# Altium footprint library SparkFun.PCBLIB: 674 footprints (part 23 of 44)
Each footprint in its own frame and in the unit in brackets; x right, y up, seen from the top. Pads: shape width x height; smd on the part's side, far side on the other; paste and mask are expansions set on the pad; w line width, h text height; cw(c..) or ccw(c..) is an arc to the next point about the centre after c.
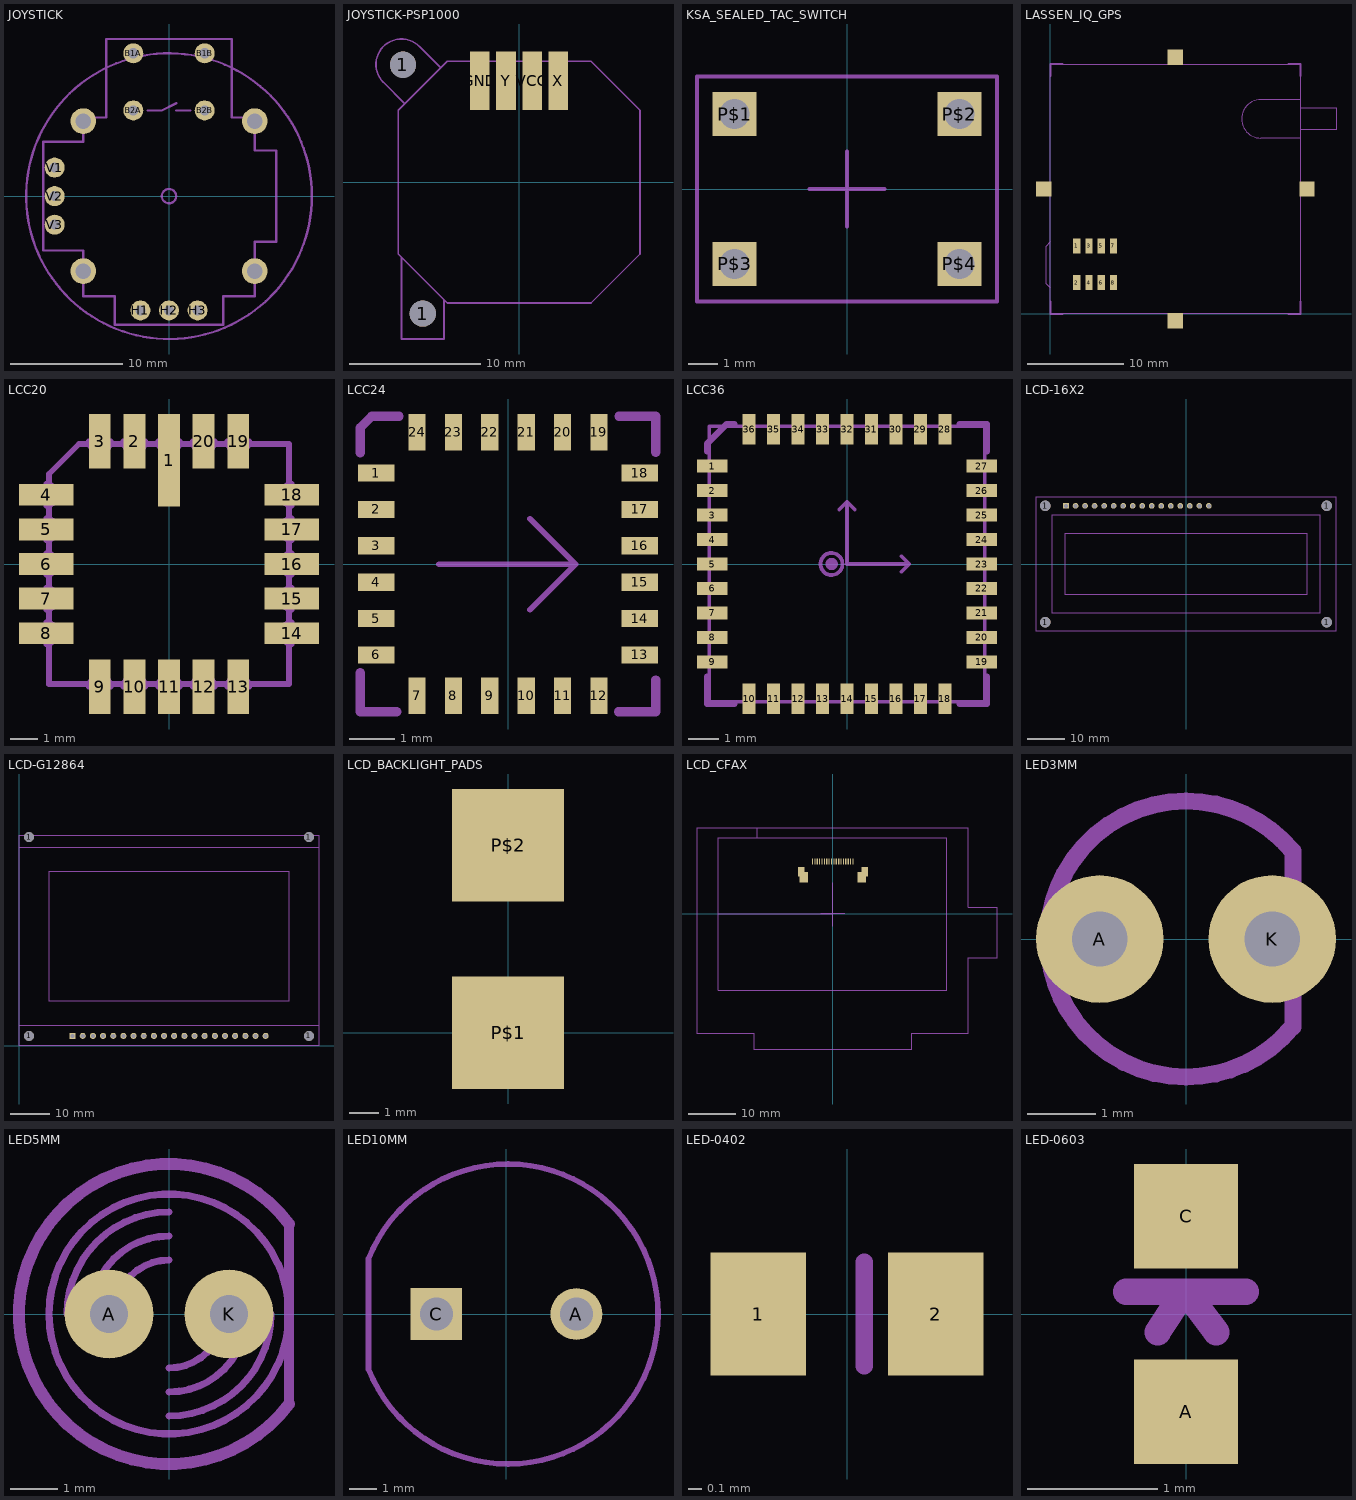
[diagram p22: the footprints below, top view; thin cyan lines are the x and y axes]

## JOYSTICK [mil]
pads (14):
  round 70 hole 35.43: B1A(-125,500) B1B(125,500) B2A(-125,300) B2B(125,300)
  round 70 hole 35: H1(-100,-400) H2(0,-400) H3(100,-400) V1(-400,100) V2(-400,0) V3(-400,-100)
  round 90 hole 55: MOUNT1(-300,262.5) MOUNT2(-300,-262.5) MOUNT3(300,-262.5) MOUNT4(300,262.5)
Mechanical 2:
  circle w8: c0,0 r25
  lines w8: -440,-190 -300,-190 -300,-350 -190,-350 -190,-450 190,-450 190,-350 300,-350 300,-160 375,-160 375,160 300,160 300,275 220,275 220,550 -220,550 -220,275 -300,275 -300,190 -440,190 -440,-190
Mechanical 18:
  circle w8: c0,0 r500
  lines w8: -75,300 -25,300 25,325 ; 25,300 75,300

## JOYSTICK-PSP1000 [mm]
pads (6):
  round 2 hole 2: 1(-8.89,8.985) 1(-7.375,-10.06)
  rect 1.5x4.5 smd: GND(-3,7.75) VCC(1,7.75) X(3,7.75) Y(-1,7.75)
Mechanical 18:
  lines w0.127: -10.4,7.658 -8.75,6 ; -10.381,7.631 cw(c-9.006,9.006) -7.631,10.381 ; -7.65,10.408 -6,8.75 ; -9,-5.75 -9.25,-5.5 -9.25,5.5 -8.75,6 ; -9,-5.75 -5.75,-9 ; -9,-5.75 -9,-12 -5.75,-12 -5.75,-9 ; -8.75,6 -6,8.75 ; -6,8.75 -5.5,9.25 5.5,9.25 9.25,5.5 9.25,-5.5 5.5,-9.25 -5.5,-9.25 -5.75,-9

## KSA_SEALED_TAC_SWITCH [mm]
pads (4):
  rect 1.5x1.5 hole 1: P$1(-3.81,2.54) P$2(3.81,2.54) P$3(-3.81,-2.54) P$4(3.81,-2.54)
Mechanical 2:
  lines w0.127: -1.27,0 1.27,0 ; 0,-1.27 0,1.27 ; -5.08,-3.81 5.08,-3.81 5.08,3.81 -5.08,3.81 -5.08,-3.81

## LASSEN_IQ_GPS [mil]
pads (12):
  rect 30x60 smd: 1(108.35,278.58) 2(108.35,128.58) 3(158.35,278.58) 4(158.35,128.58) 5(208.35,278.58) 6(208.35,128.58) 7(258.35,278.58) 8(258.35,128.58)
  rect 62.99x62.99 smd paste-31.5: GND1(-27.56,511.81) GND2(511.81,1051.18) GND3(1051.18,511.81) GND4(511.81,-27.56)
Mechanical 2:
  lines w8: 0,50 0,0 50,0 ; 0,975 0,1025 50,1025 ; 975,0 1025,0 1025,50 ; 975,1025 1025,1025 1025,975
Mechanical 18:
  lines w5: 1023.62,720.47 862.2,720.47 cw(c862.2,799.21) 862.2,877.95 1023.62,877.95 ; 1025,755 1170,755 1170,845 1025,845 ; 0,106.3 0,0 1023.62,0 1023.62,1023.62 0,1023.62 0,295.28 ; 0,106.3 0,295.28 ; 0,106.3 -19.69,125.98 -19.69,275.59 0,295.28

## LCC20 [mil]
pads (20):
  rect 31.5x133.86 smd: 1(0,149.61)
  rect 31.5x78.74 smd: 2(-50,177.17) 3(-100,177.17) 9(-100,-177.17) 10(-50,-177.17) 11(0,-177.17) 12(50,-177.17) 13(100,-177.17) 19(100,177.17) 20(50,177.17)
  rect 78.74x31.5 smd: 4(-177.17,100) 5(-177.17,50) 6(-177.17,0) 7(-177.17,-50) 8(-177.17,-100) 14(177.17,-100) 15(177.17,-50) 16(177.17,0) 17(177.17,50) 18(177.17,100)
Mechanical 18:
  lines w8: -177.17,-115.75 ccw(c-177.17,-100) -177.17,-84.25 ; -177.17,-65.75 ccw(c-177.17,-50) -177.17,-34.25 ; -177.17,-15.75 ccw(c-177.17,0) -177.17,15.75 ; -177.17,34.25 ccw(c-177.17,50) -177.17,65.75 ; -177.17,84.25 ccw(c-177.17,100) -177.17,115.75 ; -173.23,-173.62 -173.23,-173.23 ; -173.23,-115.75 -173.23,-173.23 ; -173.23,-84.25 -173.23,-65.75 ; -173.23,-34.25 -173.23,-15.75 ; -173.23,15.75 -173.23,34.25 ; -173.23,65.75 -173.23,84.25 ; -173.23,115.75 -173.23,129.92 -129.92,173.23 -115.75,173.23 ; -115.75,-177.17 cw(c-100,-177.17) -84.25,-177.17 ; -115.75,-173.23 -173.23,-173.23 ; -115.75,177.17 ccw(c-100,177.17) -84.25,177.17 ; -84.25,-173.23 -65.75,-173.23 ; -84.25,173.23 -65.75,173.23 ; -65.75,-177.17 cw(c-50,-177.17) -34.25,-177.17 ; -65.75,177.17 ccw(c-50,177.17) -34.25,177.17 ; -34.25,-173.23 -15.75,-173.23 ; -34.25,173.23 -15.75,173.23 ; -15.75,-177.17 cw(c0,-177.17) 15.75,-177.17 ; -15.75,177.17 ccw(c0,177.17) 15.75,177.17 ; 15.75,-173.23 34.25,-173.23 ; 15.75,173.23 34.25,173.23 ; 34.25,-177.17 cw(c50,-177.17) 65.75,-177.17 ; 34.25,177.17 ccw(c50,177.17) 65.75,177.17 ; 65.75,-173.23 84.25,-173.23 ; 65.75,173.23 84.25,173.23 ; 84.25,-177.17 cw(c100,-177.17) 115.75,-177.17 ; 84.25,177.17 ccw(c100,177.17) 115.75,177.17 ; 115.75,-173.23 173.23,-173.23 173.23,-115.75 ; 115.75,173.23 173.23,173.23 173.23,115.75 ; 173.23,-84.25 173.23,-65.75 ; 173.23,-34.25 173.23,-15.75 ; 173.23,15.75 173.23,34.25 ; 173.23,65.75 173.23,84.25 ; 177.17,-115.75 cw(c177.17,-100) 177.17,-84.25 ; 177.17,-65.75 cw(c177.17,-50) 177.17,-34.25 ; 177.17,-15.75 cw(c177.17,0) 177.17,15.75 ; 177.17,34.25 cw(c177.17,50) 177.17,65.75 ; 177.17,84.25 cw(c177.17,100) 177.17,115.75

## LCC24 [mm]
pads (24):
  rect 0.8x0.38 smd: 1(-2.9,2.01) 2(-2.9,1.21) 3(-2.9,0.41) 4(-2.9,-0.39) 5(-2.9,-1.19) 6(-2.9,-1.99) 13(2.9,-1.99) 14(2.9,-1.19) 15(2.9,-0.39) 16(2.9,0.41) 17(2.9,1.21) 18(2.9,2.01)
  rect 0.38x0.8 smd: 7(-2,-2.89) 8(-1.2,-2.89) 9(-0.4,-2.89) 10(0.4,-2.89) 11(1.2,-2.89) 12(2,-2.89) 19(2,2.91) 20(1.2,2.91) 21(0.4,2.91) 22(-0.4,2.91) 23(-1.2,2.91) 24(-2,2.91)
Mechanical 2:
  lines w0.203: -3.25,-2.38 -3.25,-3.24 -2.45,-3.24 ; -3.25,2.46 -3.25,3.01 -3,3.26 -2.4,3.26 ; 2.43,-3.24 3.25,-3.24 3.25,-2.54 ; 2.44,3.26 3.25,3.26 3.25,2.47
Mechanical 18:
  lines w0.127: -1.515,0.005 1.485,0.005 ; 0.485,-0.995 1.485,0.005 ; 0.485,1.005 1.485,0.005

## LCC36 [mm]
pads (36):
  rect 1x0.42 smd: 1(-4.4,3.2) 2(-4.4,2.4) 3(-4.4,1.6) 4(-4.4,0.8) 5(-4.4,0) 6(-4.4,-0.8) 7(-4.4,-1.6) 8(-4.4,-2.4) 9(-4.4,-3.2) 19(4.4,-3.2) 20(4.4,-2.4) 21(4.4,-1.6) 22(4.4,-0.8) 23(4.4,0) 24(4.4,0.8) 25(4.4,1.6) 26(4.4,2.4) 27(4.4,3.2)
  rect 0.42x1 smd: 10(-3.2,-4.4) 11(-2.4,-4.4) 12(-1.6,-4.4) 13(-0.8,-4.4) 14(0,-4.4) 15(0.8,-4.4) 16(1.6,-4.4) 17(2.4,-4.4) 18(3.2,-4.4) 28(3.2,4.4) 29(2.4,4.4) 30(1.6,4.4) 31(0.8,4.4) 32(0,4.4) 33(-0.8,4.4) 34(-1.6,4.4) 35(-2.4,4.4) 36(-3.2,4.4)
Mechanical 2:
  lines w0.203: -4.572,-3.683 -4.572,-4.572 -3.683,-4.572 ; -4.572,3.683 -4.572,3.937 -3.937,4.572 -3.683,4.572 ; 3.683,-4.572 4.572,-4.572 4.572,-3.683 ; 3.683,4.572 4.572,4.572 4.572,3.683
Mechanical 18:
  circle w0.127: c-0.508,0 r0.359
  circle w0.203: c-0.5,0 r0.1
  lines w0.127: -0.254,1.778 0,2.032 ; 0.254,1.778 0,2.032 ; 1.778,-0.254 2.032,0 ; 1.778,0.254 2.032,0 ; 0,2.032 0,0 2.032,0 ; -4.5,-4.5 -4.5,4.5 4.5,4.5 4.5,-4.5 -4.5,-4.5

## LCD-16X2 [mil]
pads (20):
  round 110.24 hole 110.24: 1(-1476.38,-610.24) 1(-1476.38,610.24) 1(1476.38,-610.24) 1(1476.38,610.24)
  rect 60x60 hole 40: 1(-1259.84,610.24)
  round 60 hole 40: 2(-1159.84,610.24) 3(-1059.84,610.24) 4(-959.84,610.24) 5(-859.84,610.24) 6(-759.84,610.24) 7(-659.84,610.24) 8(-559.84,610.24) 9(-459.84,610.24) 10(-359.84,610.24) 11(-259.84,610.24) 12(-159.84,610.24) 13(-59.84,610.24) 14(40.16,610.24) 15(140.16,610.24) 16(240.16,610.24)
Mechanical 2:
  lines w8: -1574.8,-708.66 1574.8,-708.66 1574.8,708.66 -1574.8,708.66 -1574.8,-708.66 ; -1403.54,-517.72 1403.54,-517.72 1403.54,517.72 -1403.54,517.72 -1403.54,-517.72
Mechanical 14:
  lines w8: -1269.69,-322.83 1269.69,-322.83 1269.69,322.83 -1269.69,322.83 -1269.69,-322.83

## LCD-G12864 [mil]
pads (24):
  round 98.43 hole 98.43: 1(98.43,98.43) 1(98.43,2055.12) 1(2854.33,98.43) 1(2854.33,2055.12)
  rect 60x60 hole 40: 1(527.56,98.43)
  round 60 hole 40: 2(627.56,98.43) 3(727.56,98.43) 4(827.56,98.43) 5(927.56,98.43) 6(1027.56,98.43) 7(1127.56,98.43) 8(1227.56,98.43) 9(1327.56,98.43) 10(1427.56,98.43) 11(1527.56,98.43) 12(1627.56,98.43) 13(1727.56,98.43) 14(1827.56,98.43) 15(1927.56,98.43) 16(2027.56,98.43) 17(2127.56,98.43) 18(2227.56,98.43) 19(2327.56,98.43) 20(2427.56,98.43)
Mechanical 2:
  lines w8: 0,196.85 0,0 2952.76,0 2952.76,196.85 ; 0,196.85 0,1956.69 ; 0,196.85 2952.76,196.85 ; 0,1956.69 0,2074.8 2952.76,2074.8 2952.76,1956.69 ; 0,1956.69 2952.76,1956.69 ; 2952.76,196.85 2952.76,1956.69 ; 295.28,437.01 295.28,1720.47 2657.48,1720.47 2657.48,437.01 295.28,437.01

## LCD_BACKLIGHT_PADS [mil]
pads (2):
  rect 150x150 smd: P$1(0,0) P$2(0,250)

## LCD_CFAX [mm]
pads (22):
  rect 0.25x1.3 smd: P$1(-4.25,11.05) P$2(-3.75,11.05) P$3(-3.25,11.05) P$4(-2.75,11.05) P$5(-2.25,11.05) P$6(-1.75,11.05) P$7(-1.25,11.05) P$8(-0.75,11.05) P$9(-0.25,11.05) P$10(0.25,11.05) P$11(0.75,11.05) P$12(1.25,11.05) P$13(1.75,11.05) P$14(2.25,11.05) P$15(2.75,11.05) P$16(3.25,11.05) P$17(3.75,11.05) P$18(4.25,11.05)
  rect 1.4x2 smd: P$19(-6.6,8.85) P$20(6.7,8.85)
  rect 1.8x2.2 smd: P$21(6.1,7.75) P$22(-6.1,7.75)
Mechanical 2:
  lines w0.127: -15.9,16 -16,16 ; -16,16 -24,16 -24,0 -24,-16 24,-16 24,16 -16,16 ; -28.5,-25 -28.5,18 -15.9,18 28.5,18 28.5,1.46 34.5,1.46 34.5,-9.175 28.5,-9.175 28.5,-25 16.5,-25 16.5,-28.5 -16.5,-28.5 -16.5,-25 -28.5,-25
Mechanical 18:
  lines w0.127: -24,0 0,0 ; -15.9,16 -15.9,18 ; -2.54,0 2.54,0 ; 0,-2.54 0,6.54

## LED3MM [mil]
pads (2):
  round 74 hole 32: A(-50,0) K(50,0)
Mechanical 2:
  lines w10: -70.59,37.65 cw(c0,0) 0,80 cw(c0.01,0) 61.46,51.22 ; -69.46,-39.69 ccw(c0,0) 0,-80 ccw(c0,0) 61.07,-51.68 ; 62,-51 62,-33 ; 62,31 62,51
Mechanical 18:
  lines w10: -70.44,37.93 ccw(c0,0.01) -80,0 ccw(c0,0) -68.13,-41.93 ; 62,-50 62,50

## LED5MM [mil]
pads (2):
  round 74 hole 32: A(-50,0) K(50,0)
Mechanical 2:
  circle w6: c0,0 r100
  lines w8: 100,-75 100,75
  lines w10: 100,-75 cw(c0,0) 100,75
Mechanical 18:
  lines w6: -85,0 cw(c0,0) 0,85 ; -65,0 cw(c0,0) 0,65 ; -45,0 cw(c0,0) 0,45 ; 0,-85 ccw(c0,0) 85,0 ; 0,-65 ccw(c0,0) 65,0 ; 0,-45 ccw(c0,0) 45,0

## LED10MM [mil]
pads (2):
  round 74 hole 47.24: A(100,0)
  rect 74x74 hole 47.24: C(-100,0)
Mechanical 2:
  lines w8: -196.85,-78.74 ccw(c2.34,0) -196.85,78.74 -196.85,-78.74

## LED-0402 [mm]
pads (2):
  rect 0.7x0.9 smd: 1(-0.65,0) 2(0.65,0)
Mechanical 2:
  lines w0.127: 0.127,-0.381 0.127,0.381

## LED-0603 [mil]
pads (2):
  rect 31.5x31.5 smd: A(0,-29.53) C(0,29.53)
Mechanical 2:
  lines w8: -18.11,6.69 0,6.69 ; -8.6,-5.51 -1,6.09 ; 9.2,-5.51 0,6.69 ; 18.11,6.69 0,6.69